# Altium footprint library GyokuRe.PcbLib: 1248 footprints (part 7 of 78)
Each footprint in its own frame and in the unit in brackets; x right, y up, seen from the top. Pads: shape width x height; smd on the part's side, far side on the other; paste and mask are expansions set on the pad; w line width, h text height; cw(c..) or ccw(c..) is an arc to the next point about the centre after c.
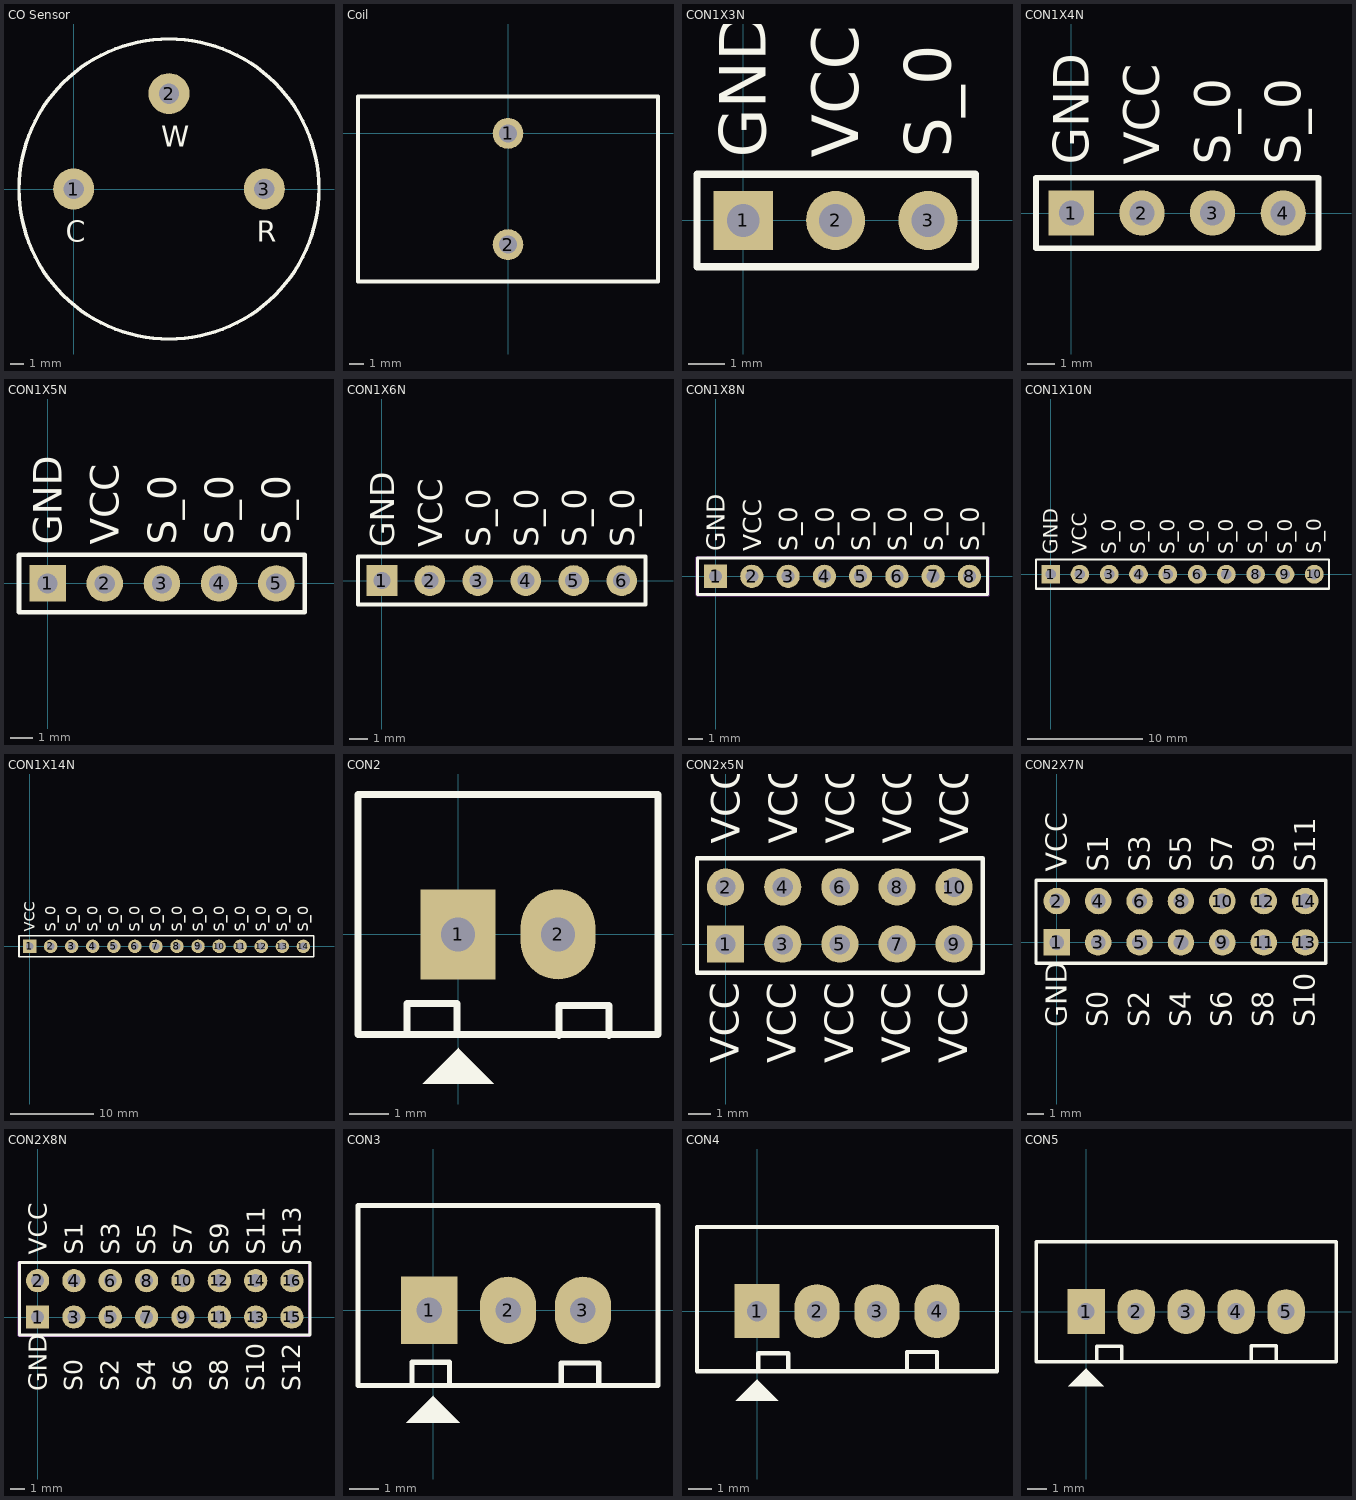
[diagram p6: the footprints below, top view; thin cyan lines are the x and y axes]

## CO Sensor [mm]
pads (3):
  round 3 hole 1.5: 1(0,0) 2(7,7) 3(14,0)
Top Overlay:
  circle w0.254: c7,0 r11
  text "C" at -0.559,-3.886 h1.52
  text "W" at 6.441,3.114 h1.52
  text "R" at 13.441,-3.886 h1.52

## Coil [mil] "Ferrite Coil; Filter; Solder Pad 35mil"
pads (2):
  round 83 hole 48: 1(0,0) 2(0,-300)
Top Overlay:
  lines w10: -405,-400 405,-400 405,100 -405,100 -405,-400

## CON1X3N [mil]
pads (3):
  rect 64x64 hole 35.43: 1(0,0)
  round 64 hole 35.43: 2(100,0) 3(200,0)
Top Overlay:
  lines w7.87: -50,-50 251,-50 251,50 -50,50 -50,-50
  text "S_0" at 224.67,68.04 h50
  text "." at -84.65,62.04 h39.37
  text "GND" at 24.52,68.04 h50
  text "VCC" at 124.59,68.04 h50
Bottom Overlay:
  lines w7.87: -50,-50 251,-50 251,50 -50,50 -50,-50
  text "." at -84.65,60.04 h39.37
  text "GND" at 25.52,220.04 h50
  text "VCC" at 125.59,220.04 h50
  text "S_0" at 225.67,220.04 h50
3D body: height 350, standoff -100, extent 190,-10 210,10
3D body: height 350, standoff -100, extent 90,-10 110,10
3D body: height 350, standoff -100, extent -10,-10 10,10
3D body: height 100, standoff 10, extent -50,-50 150,50
3D body: height 100, standoff 10, extent 50,-50 250,50

## CON1X4N [mil]
pads (4):
  rect 64x64 hole 35.43: 1(0,0)
  round 64 hole 35.43: 2(100,0) 3(200,0) 4(300,0)
Top Overlay:
  lines w7.87: -50,-50 350,-50 350,50 -50,50 -50,-50
  text "S_0" at 324.74,68.04 h50
  text "S_0" at 224.67,68.04 h50
  text "." at -84.65,62.04 h39.37
  text "GND" at 24.52,68.04 h50
  text "VCC" at 124.59,68.04 h50
Bottom Overlay:
  lines w7.87: -50,-50 350,-50 350,50 -50,50 -50,-50
  text "." at -84.65,60.04 h39.37
  text "GND" at 25.52,220.04 h50
  text "VCC" at 125.59,220.04 h50
  text "S_0" at 225.67,220.04 h50
  text "S_0" at 325.74,220.04 h50
Mechanical 13:
  text ".Designator" at 9,-29 h80
3D body: height 350, standoff -100, extent 290,-10 310,10
3D body: height 350, standoff -100, extent 190,-10 210,10
3D body: height 350, standoff -100, extent 90,-10 110,10
3D body: height 350, standoff -100, extent -10,-10 10,10
3D body: height 100, standoff 10, extent -50,-50 150,50
3D body: height 100, standoff 10, extent 50,-50 250,50
3D body: height 100, standoff 10, extent 150,-50 350,50

## CON1X5N [mil]
pads (5):
  rect 64x64 hole 35.43: 1(0,0)
  round 64 hole 35.43: 2(100,0) 3(200,0) 4(300,0) 5(400,0)
Top Overlay:
  lines w7.87: -50,-50 450,-50 450,50 -50,50 -50,-50
  text "S_0" at 424.82,68.04 h50
  text "S_0" at 324.74,68.04 h50
  text "S_0" at 224.67,68.04 h50
  text "VCC" at 124.59,68.04 h50
  text "GND" at 24.52,68.04 h50
Mechanical 13:
  text ".Designator" at 99,-24 h80
3D body: height 350, standoff -100, extent 289.84,-10 309.84,10
3D body: height 350, standoff -100, extent 390,-10 410,10
3D body: height 100, standoff 10, extent 250,-50 450,50
3D body: height 350, standoff -100, extent 190,-10 210,10
3D body: height 100, standoff 10, extent 150,-50 350,50
3D body: height 350, standoff -100, extent 90,-10 110,10
3D body: height 100, standoff 10, extent 50,-50 250,50
3D body: height 350, standoff -100, extent -10,-10 10,10
3D body: height 100, standoff 10, extent -50,-50 150,50
3D body: height 350, standoff -100, extent -10,-10 10,10
3D body: height 350, standoff -100, extent 90,-10 110,10
3D body: height 350, standoff -100, extent 190,-10 210,10
3D body: height 350, standoff -100, extent 290,-10 310,10
3D body: height 350, standoff -100, extent 390,-10 410,10

## CON1X6N [mil]
pads (6):
  rect 64x64 hole 35.43: 1(0,0)
  round 64 hole 35.43: 2(100,0) 3(200,0) 4(300,0) 5(400,0) 6(500,0)
Top Overlay:
  lines w7.87: -50,-50 550,-50 550,50 -50,50 -50,-50
  text "VCC" at 125.58,69.02 h50
  text "S_0" at 225.65,69.02 h50
  text "S_0" at 325.73,69.02 h50
  text "S_0" at 425.8,69.02 h50
  text "S_0" at 525.88,69.02 h50
  text "GND" at 25.5,69.02 h50
Bottom Overlay:
  lines w3.94: -50,-50 -50,50 550,50 550,-50 -50,-50
  text "GND" at 525.5,69.02 h50
  text "GND" at 425.5,69.02 h50
  text "GND" at 325.5,69.02 h50
  text "GND" at 225.5,69.02 h50
  text "GND" at 125.5,69.02 h50
  text "GND" at 25.5,69.02 h50
Mechanical 13:
  text ".Designator" at 129,-29 h80
3D body: height 350, standoff -100, extent 390,-10 410,10
3D body: height 350, standoff -100, extent 490,-10 510,10
3D body: height 100, standoff 10, extent 350,-50 550,50
3D body: height 350, standoff -100, extent 290,-10 310,10
3D body: height 100, standoff 10, extent 250,-50 450,50
3D body: height 350, standoff -100, extent 190,-10 210,10
3D body: height 100, standoff 10, extent 150,-50 350,50
3D body: height 350, standoff -100, extent 90,-10 110,10
3D body: height 100, standoff 10, extent 50,-50 250,50
3D body: height 350, standoff -100, extent -10,-10 10,10
3D body: height 100, standoff 10, extent -50,-50 150,50
3D body: height 350, standoff -100, extent -10,-10 10,10
3D body: height 350, standoff -100, extent 90,-10 110,10
3D body: height 350, standoff -100, extent 190,-10 210,10
3D body: height 350, standoff -100, extent 290,-10 310,10
3D body: height 350, standoff -100, extent 390,-10 410,10
3D body: height 350, standoff -100, extent 490,-10 510,10

## CON1X8N [mil]
pads (8):
  rect 64x64 hole 35.43: 1(0,0)
  round 64 hole 35.43: 2(100,0) 3(200,0) 4(300,0) 5(400,0) 6(500,0) 7(600,0) 8(700,0)
Top Overlay:
  lines w7.87: -50,-50 -50,50 750,50 750,-50 -50,-50
  text "." at -90,-85 h100
  text "GND" at 25.5,69.02 h50
  text "VCC" at 125.58,69.02 h50
  text "S_0" at 225.65,69.02 h50
  text "S_0" at 325.73,69.02 h50
  text "S_0" at 425.8,69.02 h50
  text "S_0" at 525.88,69.02 h50
  text "S_0" at 625.95,69.02 h50
  text "S_0" at 726.03,69.02 h50
Bottom Overlay:
  lines w3.94: -50,-51 753,-51 753,52 -50,52 -50,-51
  text "GND" at 26.5,200.02 h50
  text "VCC" at 126.58,200.02 h50
  text "S_0" at 226.65,200.02 h50
  text "S_0" at 326.73,200.02 h50
  text "S_0" at 426.8,200.02 h50
  text "S_0" at 526.88,200.02 h50
  text "S_0" at 626.95,200.02 h50
  text "S_0" at 727.03,200.02 h50
Mechanical 13:
  lines w7.87: -51.18,-51.18 751.97,-51.18 751.97,51.18 -51.18,51.18 -51.18,-51.18
  text ".Designator" at 239,-19 h80
3D body: height 350, standoff -100, extent -10,-10 10,10
3D body: height 100, standoff 10, extent -50,-50 150,50
3D body: height 350, standoff -100, extent 90,-10 110,10
3D body: height 100, standoff 10, extent 50,-50 250,50
3D body: height 350, standoff -100, extent 190,-10 210,10
3D body: height 100, standoff 10, extent 150,-50 350,50
3D body: height 350, standoff -100, extent 390,-10 410,10
3D body: height 350, standoff -100, extent 290,-10 310,10
3D body: height 100, standoff 10, extent 250,-50 450,50
3D body: height 350, standoff -100, extent 390,-10 410,10
3D body: height 100, standoff 10, extent 350,-50 550,50
3D body: height 350, standoff -100, extent 490,-10 510,10
3D body: height 100, standoff 10, extent 450,-50 650,50
3D body: height 350, standoff -100, extent 690,-10 710,10
3D body: height 350, standoff -100, extent 590,-10 610,10
3D body: height 100, standoff 10, extent 550,-50 750,50

## CON1X10N [mil]
pads (10):
  rect 64x64 hole 35.43: 1(0,0)
  round 64 hole 35.43: 2(100,0) 3(200,0) 4(300,0) 5(400,0) 6(500,0) 7(600,0) 8(700,0) 9(800,0) 10(900,0)
Top Overlay:
  lines w7.87: -50,-50 950,-50 950,50 25,50 -50,50 -50,-50
  text "S_0" at 924.21,69.88 h50
  text "S_0" at 824.14,69.02 h50
  text "S_0" at 724.06,69.02 h50
  text "S_0" at 623.99,69.02 h50
  text "S_0" at 523.91,69.02 h50
  text "S_0" at 423.84,69.02 h50
  text "S_0" at 323.76,69.02 h50
  text "S_0" at 223.69,69.02 h50
  text "VCC" at 123.61,69.02 h50
  text "GND" at 23.53,69.02 h50
Bottom Overlay:
  text "S_0" at 722.03,200.02 h50
  text "S_0" at 621.95,200.02 h50
  text "S_0" at 521.88,200.02 h50
  text "S_0" at 421.8,200.02 h50
  text "S_0" at 321.73,200.02 h50
  text "S_0" at 221.65,200.02 h50
  text "VCC" at 121.58,200.02 h50
  text "GND" at 21.5,200.02 h50
  text "S_0" at 822.03,200.02 h50
  text "S_0" at 922.03,200.02 h50
Mechanical 13:
  text ".Designator" at 339,-14 h80
3D body: height 350, standoff -100, extent 790,-10 810,10
3D body: height 350, standoff -100, extent 890,-10 910,10
3D body: height 100, standoff 10, extent 750,-50 950,50
3D body: height 350, standoff -100, extent 690,-10 710,10
3D body: height 100, standoff 10, extent 650,-50 850,50
3D body: height 350, standoff -100, extent 590,-10 610,10
3D body: height 100, standoff 10, extent 550,-50 750,50
3D body: height 350, standoff -100, extent 490,-10 510,10
3D body: height 100, standoff 10, extent 450,-50 650,50
3D body: height 350, standoff -100, extent 390,-10 410,10
3D body: height 100, standoff 10, extent 350,-50 550,50
3D body: height 350, standoff -100, extent 290,-10 310,10
3D body: height 100, standoff 10, extent 250,-50 450,50
3D body: height 350, standoff -100, extent 190,-10 210,10
3D body: height 100, standoff 10, extent 150,-50 350,50
3D body: height 350, standoff -100, extent 90,-10 110,10
3D body: height 100, standoff 10, extent 50,-50 250,50
3D body: height 100, standoff 10, extent -50,-50 150,50
3D body: height 350, standoff -100, extent -10,-10 10,10

## CON1X14N [mil]
pads (14):
  rect 64x64 hole 35.43: 1(0,0)
  round 64 hole 35.43: 2(100,0) 3(200,0) 4(300,0) 5(400,0) 6(500,0) 7(600,0) 8(700,0) 9(800,0) 10(900,0) 11(1000,0) 12(1100,0) 13(1200,0) 14(1300,0)
Top Overlay:
  lines w7.87: -50,-50 1350,-50 1350,50 25,50 -50,50 -50,-50
  text "S_0" at 923.91,69.02 h50
  text "S_0" at 1023.99,69.02 h50
  text "S_0" at 1124.06,69.02 h50
  text "S_0" at 1224.14,69.02 h50
  text "S_0" at 1324.21,69.88 h50
  text "VCC" at 23.61,69.02 h50
  text "S_0" at 123.69,69.02 h50
  text "S_0" at 223.76,69.02 h50
  text "S_0" at 323.84,69.02 h50
  text "S_0" at 423.91,69.02 h50
  text "S_0" at 523.99,69.02 h50
  text "S_0" at 624.06,69.02 h50
  text "S_0" at 724.14,69.02 h50
  text "S_0" at 824.21,69.88 h50
Bottom Overlay:
  lines w7.87: -50,-50 -50,50 1350,50 1350,-50 -50,-50
  text "S_0" at 22.03,200.02 h50
  text "S_0" at 1322.03,200.02 h50
  text "S_0" at 1222.03,200.02 h50
  text "S_0" at 1122.03,200.02 h50
  text "S_0" at 1022.03,200.02 h50
  text "S_0" at 920.03,198.02 h50
  text "S_0" at 822.03,200.02 h50
  text "S_0" at 722.03,200.02 h50
  text "S_0" at 622.03,200.02 h50
  text "S_0" at 522.03,200.02 h50
  text "S_0" at 422.03,200.02 h50
  text "S_0" at 322.03,200.02 h50
  text "S_0" at 222.03,200.02 h50
  text "S_0" at 122.03,200.02 h50

## CON2 [mil] "CON2"
height 200
pads (2):
  rect 75x90 hole 34: 1(0,0)
  oval 75x90 hole 34: 2(100,0)
Top Overlay:
  region: -35.5,-149.5 35.5,-149.5 0.5,-114.5 0.5,-113.5
  lines w7: -51,-99 -51,-69 -1,-69 -1,-99 ; 101,-101 101,-71 151,-71 151,-101 ; -100,-100 -100,140 200,140 200,-100 -100,-100
3D body "User Library-PCB HEADER (JST BxB-PH-K-S (VERTICAL)).STEP": height 236.22, standoff -75, extent -68.11,-70 168.11,107.17

## CON2x5N [mil]
pads (10):
  rect 65x65 hole 35.43: 1(0,0)
  round 65 hole 35.43: 2(0,100) 3(100,0) 4(100,100) 5(200,0) 6(200,100) 7(300,0) 8(300,100) 9(400,0) 10(400,100)
Top Overlay:
  lines w7.87: -50,-50 -50,150 450,150 450,-50 -50,-50
  text "VCC" at 425,176 h50
  text "VCC" at 325,176 h50
  text "VCC" at 225,176 h50
  text "VCC" at 125,176 h50
  text "VCC" at 25,176 h50
  text "VCC" at 423,-208 h50
  text "VCC" at 323,-208 h50
  text "VCC" at 223,-208 h50
  text "VCC" at 123,-208 h50
  text "VCC" at 23,-208 h50
  text "." at -97,-106 h39.37
Bottom Overlay:
  lines w3.94: -50,-49 450,-49 450,149 -50,149 -50,-49
  text "VCC" at 26,-71 h50
  text "VCC" at 126,-71 h50
  text "VCC" at 226,-71 h50
  text "VCC" at 326,-71 h50
  text "VCC" at 426,-71 h50
  text "." at -97,-106 h39.37
  text "VCC" at 24,305 h50
  text "VCC" at 124,305 h50
  text "VCC" at 217,303 h50
  text "VCC" at 324,305 h50
  text "VCC" at 424,305 h50
3D body: height 100, standoff 10, extent -51,-51 49,149
3D body: height 100, standoff 10, extent 49,-51 149,149
3D body: height 100, standoff 10, extent 149,-51 249,149
3D body: height 100, standoff 10, extent 249,-51 349,149
3D body: height 100, standoff 10, extent 349,-51 449,149
3D body: height 350, standoff -100, extent -10,90 10,110
3D body: height 350, standoff -100, extent -10,-10 10,10
3D body: height 350, standoff -100, extent 90,90 110,110
3D body: height 350, standoff -100, extent 90,-10 110,10
3D body: height 350, standoff -100, extent 190,-10 210,10
3D body: height 350, standoff -100, extent 190,90 210,110
3D body: height 350, standoff -100, extent 290,90 310,110
3D body: height 350, standoff -100, extent 290,-10 310,10
3D body: height 350, standoff -100, extent 390,-10 410,10
3D body: height 350, standoff -100, extent 390,90 410,110

## CON2X7N [mil]
pads (14):
  rect 64x64 hole 35.43: 1(0,0)
  round 64 hole 35.43: 2(0,100) 3(100,0) 4(100,100) 5(200,0) 6(200,100) 7(300,0) 8(300,100) 9(400,0) 10(400,100) 11(500,0) 12(500,100) 13(600,0) 14(600,100)
Top Overlay:
  lines w7.87: -50,-50 650,-50 650,150 -50,150 -50,-50
  text "S3" at 224.41,171.26 h50
  text "S1" at 124.51,171.26 h50
  text "S5" at 324.31,171.26 h50
  text "S7" at 424.21,171.26 h50
  text "S11" at 624.51,171.26 h50
  text "S9" at 524.61,171.26 h50
  text "S6" at 423.14,-204.72 h50
  text "S4" at 323.24,-204.72 h50
  text "S0" at 123.44,-204.72 h50
  text "S2" at 223.34,-204.72 h50
  text "GND" at 24.61,-204.72 h50
  text "." at -71.85,-80.71 h31.5
  text "S10" at 623.34,-204.72 h50
  text "S8" at 523.44,-204.72 h50
  text "VCC" at 24.61,171.26 h50
Bottom Overlay:
  lines w3.94: -50,-49 649,-49 649,150 -50,150 -50,-49
  text "VCC" at 24.61,171.26 h50
  text "VCC" at 625,299 h50
  text "VCC" at 525,299 h50
  text "VCC" at 424,298 h50
  text "VCC" at 325,299 h50
  text "VCC" at 225,299 h50
  text "VCC" at 126,300 h50
  text "VCC" at 22,297 h50
  text "VCC" at 27,-76 h50
  text "VCC" at 127,-76 h50
  text "VCC" at 227,-76 h50
  text "VCC" at 327,-76 h50
  text "VCC" at 427,-76 h50
  text "VCC" at 527,-76 h50
  text "VCC" at 627,-76 h50
3D body: height 100, standoff 10, extent 549.8,-50.2 649.8,149.8
3D body: height 350, standoff -100, extent 589.8,-10.2 609.8,9.8
3D body: height 350, standoff -100, extent 589.8,89.8 609.8,109.8
3D body: height 100, standoff 10, extent 449.8,-50.2 549.8,149.8
3D body: height 350, standoff -100, extent 489.8,-10.2 509.8,9.8
3D body: height 350, standoff -100, extent 489.8,89.8 509.8,109.8
3D body: height 100, standoff 10, extent 349.8,-50.2 449.8,149.8
3D body: height 350, standoff -100, extent 389.8,-10.2 409.8,9.8
3D body: height 350, standoff -100, extent 389.8,89.8 409.8,109.8
3D body: height 100, standoff 10, extent 249.8,-50.2 349.8,149.8
3D body: height 350, standoff -100, extent 289.8,-10.2 309.8,9.8
3D body: height 350, standoff -100, extent 289.8,89.8 309.8,109.8
3D body: height 100, standoff 10, extent 149.8,-50.2 249.8,149.8
3D body: height 350, standoff -100, extent 189.8,-10.2 209.8,9.8
3D body: height 350, standoff -100, extent 189.8,89.8 209.8,109.8
3D body: height 100, standoff 10, extent 49.8,-50.2 149.8,149.8
3D body: height 350, standoff -100, extent 89.8,-10.2 109.8,9.8
3D body: height 350, standoff -100, extent 89.8,89.8 109.8,109.8
3D body: height 100, standoff 10, extent -50.2,-50.2 49.8,149.8
3D body: height 350, standoff -100, extent -10.2,-10.2 9.8,9.8
3D body: height 350, standoff -100, extent -10.2,89.8 9.8,109.8

## CON2X8N [mil]
pads (16):
  rect 64x64 hole 35.43: 1(0,0)
  round 64 hole 35.43: 2(0,100) 3(100,0) 4(100,100) 5(200,0) 6(200,100) 7(300,0) 8(300,100) 9(400,0) 10(400,100) 11(500,0) 12(500,100) 13(600,0) 14(600,100) 15(700,0) 16(700,100)
Top Overlay:
  lines w7.87: 450,-50 -50,-50 ; -50,-50 -50,150 750,150 750,-50 -50,-50
  text "VCC" at 24.61,171.26 h50
  text "S12" at 723.24,-204.72 h50
  text "S8" at 523.44,-204.72 h50
  text "S10" at 623.34,-204.72 h50
  text "S9" at 524.61,171.26 h50
  text "S13" at 724.41,171.26 h50
  text "S11" at 624.51,171.26 h50
  text "." at -71.85,-80.71 h31.5
  text "GND" at 24.61,-204.72 h50
  text "S2" at 223.34,-204.72 h50
  text "S0" at 123.44,-204.72 h50
  text "S4" at 323.24,-204.72 h50
  text "S6" at 423.14,-204.72 h50
  text "S7" at 424.21,171.26 h50
  text "S5" at 324.31,171.26 h50
  text "S1" at 124.51,171.26 h50
  text "S3" at 224.41,171.26 h50
Bottom Overlay:
  lines w3.94: -49,-51 -49,149 749,149 749,-51 -49,-51
  text "VCC" at 726,-77 h50
  text "VCC" at 626,-77 h50
  text "VCC" at 526,-77 h50
  text "VCC" at 426,-77 h50
  text "VCC" at 326,-77 h50
  text "VCC" at 226,-77 h50
  text "VCC" at 126,-77 h50
  text "VCC" at 26,-77 h50
  text "VCC" at 723,299 h50
  text "VCC" at 623,299 h50
  text "VCC" at 523,299 h50
  text "VCC" at 423,299 h50
  text "VCC" at 323,299 h50
  text "VCC" at 223,299 h50
  text "VCC" at 123,299 h50
  text "VCC" at 23,299 h50
Mechanical 13:
  lines w7.87: -51.18,-51.18 -51.18,149.61 748.03,149.61 748.03,-51.18 -51.18,-51.18
3D body: height 350, standoff -100, extent -10.2,89.8 9.8,109.8
3D body: height 350, standoff -100, extent -10.2,-10.2 9.8,9.8
3D body: height 100, standoff 10, extent -50.2,-50.2 49.8,149.8
3D body: height 350, standoff -100, extent 89.8,89.8 109.8,109.8
3D body: height 350, standoff -100, extent 89.8,-10.2 109.8,9.8
3D body: height 100, standoff 10, extent 49.8,-50.2 149.8,149.8
3D body: height 350, standoff -100, extent 189.8,89.8 209.8,109.8
3D body: height 350, standoff -100, extent 189.8,-10.2 209.8,9.8
3D body: height 100, standoff 10, extent 149.8,-50.2 249.8,149.8
3D body: height 350, standoff -100, extent 289.8,89.8 309.8,109.8
3D body: height 350, standoff -100, extent 289.8,-10.2 309.8,9.8
3D body: height 100, standoff 10, extent 249.8,-50.2 349.8,149.8
3D body: height 350, standoff -100, extent 389.8,89.8 409.8,109.8
3D body: height 350, standoff -100, extent 389.8,-10.2 409.8,9.8
3D body: height 100, standoff 10, extent 349.8,-50.2 449.8,149.8
3D body: height 350, standoff -100, extent 489.8,89.8 509.8,109.8
3D body: height 350, standoff -100, extent 489.8,-10.2 509.8,9.8
3D body: height 100, standoff 10, extent 449.8,-50.2 549.8,149.8
3D body: height 350, standoff -100, extent 589.8,89.8 609.8,109.8
3D body: height 350, standoff -100, extent 589.8,-10.2 609.8,9.8
3D body: height 100, standoff 10, extent 549.8,-50.2 649.8,149.8
3D body: height 350, standoff -100, extent 689.8,89.8 709.8,109.8
3D body: height 350, standoff -100, extent 689.8,-10.2 709.8,9.8
3D body: height 100, standoff 10, extent 649.8,-50.2 749.8,149.8

## CON3 [mil] "CON 3"
height 200
pads (3):
  rect 75x90 hole 34: 1(-5,0)
  oval 75x90 hole 34: 2(100,0) 3(200,0)
Top Overlay:
  region: -35.5,-149.5 35.5,-149.5 0.5,-114.5 0.5,-113.5
  lines w7: -28,-99 -28,-69 22,-69 22,-99 ; 171,-100 171,-70 221,-70 221,-100 ; -100,-100 -100,140 300,140 300,0 300,-100 -100,-100
3D body "SW3dPS-jst-b3b-xh-a.STEP": height 275.59, standoff -133.86, extent -94.88,-90 294.88,136.38

## CON4 [mil] "CON4"
height 200
pads (4):
  rect 75x90 hole 34: 1(0,0)
  oval 75x90 hole 34: 2(100,0) 3(200,0) 4(300,0)
Top Overlay:
  region: -35.5,-149.5 35.5,-149.5 0.5,-114.5 0.5,-113.5
  lines w7: 2,-100 2,-70 52,-70 52,-100 ; 250,-98 250,-68 300,-68 300,-98 ; -100,-100 -100,140 400,140 400,0 400,-100 -100,-100
3D body "User Library-HEADER,JST,BxB-XH-A.STEP": height 275.59, standoff -133.86, extent -90,-90 398.19,136.38

## CON5 [mil] "CON5"
height 200
pads (5):
  rect 75x90 hole 34: 1(0,0)
  oval 75x90 hole 34: 2(100,0) 3(200,0) 4(300,0) 5(400,0)
Top Overlay:
  region: -35.5,-149.5 35.5,-149.5 0.5,-114.5 0.5,-113.5
  lines w7: 21,-99 21,-69 71,-69 71,-99 ; 330,-98 330,-68 380,-68 380,-98 ; -100,-100 -100,140 500,140 500,0 500,-100 -100,-100